# Altium footprint library ti82_lib.PcbLib: 12 footprints
Each footprint in its own frame and in the unit in brackets; x right, y up, seen from the top. Pads: shape width x height; smd on the part's side, far side on the other; paste and mask are expansions set on the pad; w line width, h text height; cw(c..) or ccw(c..) is an arc to the next point about the centre after c.
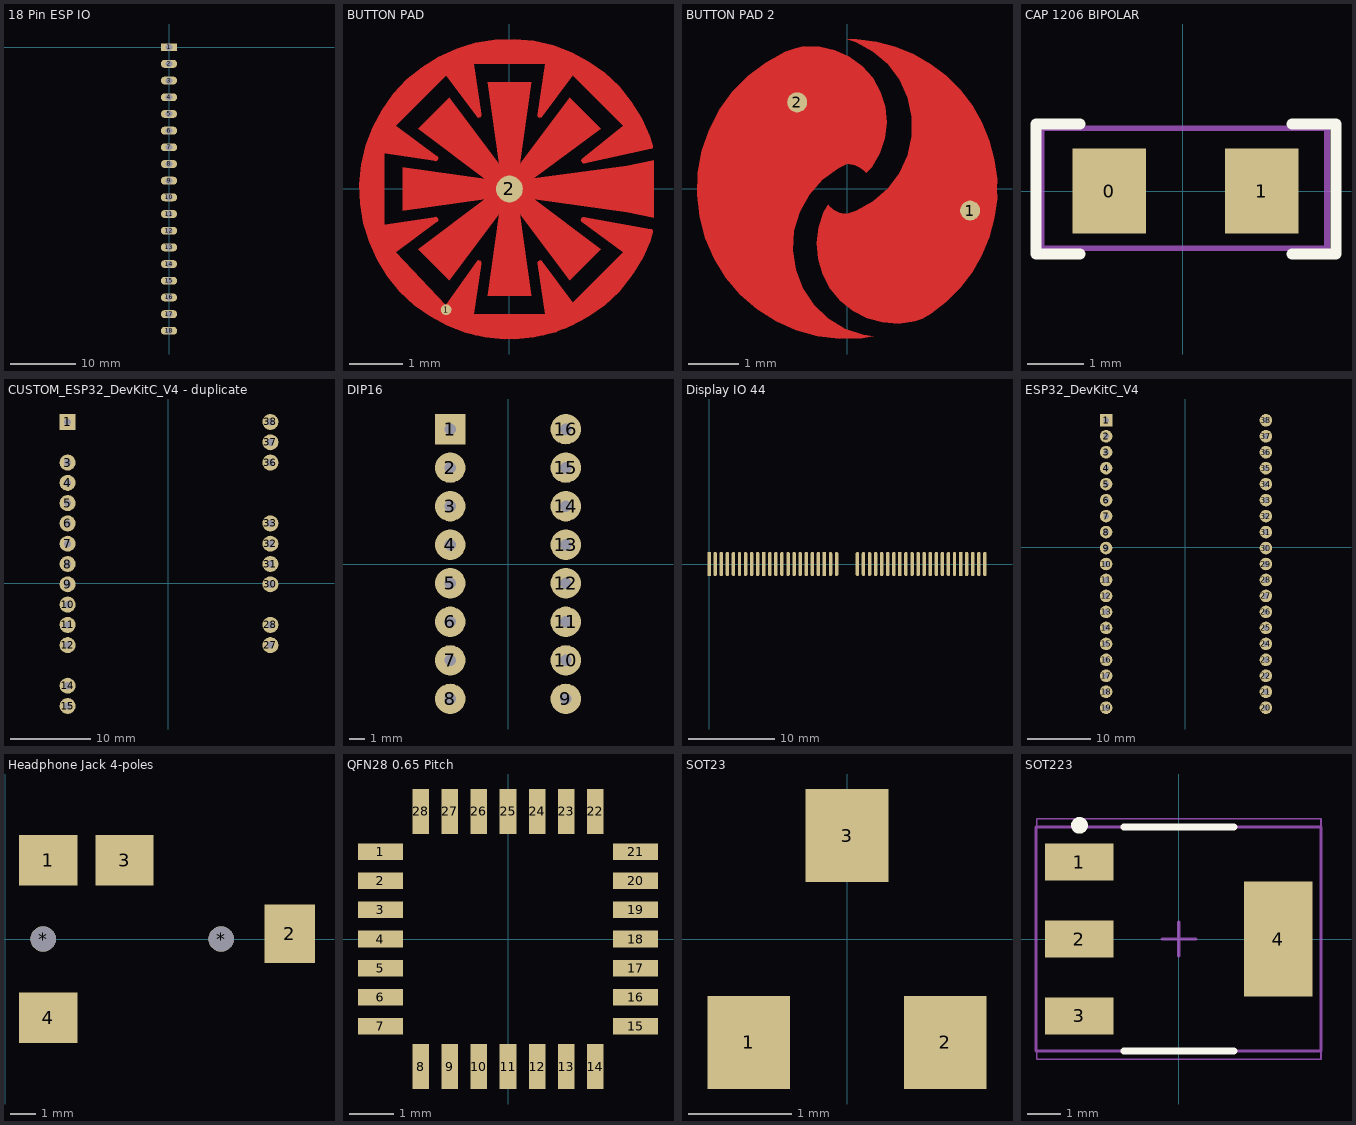
[diagram p0: the footprints below, top view; thin cyan lines are the x and y axes]

## 18 Pin ESP IO [mm]
pads (18):
  rect 2.5x1.2 hole 1: 1(0,0)
  oval 2.5x1.2 hole 1: 2(0,-2.54) 3(0,-5.08) 4(0,-7.62) 5(0,-10.16) 6(0,-12.7) 7(0,-15.24) 8(0,-17.78) 9(0,-20.32) 10(0,-22.86) 11(0,-25.4) 12(0,-27.94) 13(0,-30.48) 14(0,-33.02) 15(0,-35.56) 16(0,-38.1) 17(0,-40.64) 18(0,-43.18)

## BUTTON PAD [mm] "TI82"
pads (2):
  round 0.2 smd: 1(-1.185,-2.256)
  round 0.5 smd: 2(0,0)
Top Layer:
  region: -1.125,-1.704 -1.704,-1.125 -0.462,-0.191 -2,-0.41 -2,0.41 -0.462,0.191 -1.704,1.125 -1.125,1.704 -0.191,0.462 -0.41,2 0.41,2 0.191,0.462 1.125,1.704 1.703,1.125 0.455,0.197 2.207,0.439 2.697,0.536 2.697,-0.536 2.207,-0.439 0.462,-0.191 1.704,-1.125 1.125,-1.704 0.191,-0.462 0.41,-2 -0.41,-2 -0.191,-0.462
  region: -2.68,-0.813 -2.627,-0.989 -2.475,-1.323 -2.281,-1.635 -2.048,-1.918 -1.78,-2.169 -1.482,-2.383 -1.158,-2.556 -0.815,-2.686 -0.457,-2.769 -0.092,-2.805 0.275,-2.793 0.637,-2.733 0.813,-2.68 0.821,-2.677 0.834,-2.668 0.844,-2.655 0.849,-2.64 0.849,-2.632 0.849,-2.62 0.838,-2.598 0.819,-2.584 0.795,-2.58 0.784,-2.583 0.613,-2.629 0.265,-2.687 -0.088,-2.698 -0.44,-2.664 -0.784,-2.583 -1.114,-2.459 -1.426,-2.293 -1.713,-2.087 -1.97,-1.845 -2.194,-1.572 -2.381,-1.273 -2.527,-0.951 -2.583,-0.784 -2.589,-0.764 -2.626,-0.744 -2.666,-0.756 -2.686,-0.793
  region: 174 vertices and 0 holes, not listed, extent -2.805,-2.805 2.682,2.805
  region: -0.813,-2.68 -0.822,-2.677 -0.838,-2.664 -0.847,-2.646 -0.849,-2.627 -0.846,-2.617 -0.774,-2.378 -0.772,-2.37 -0.762,-2.357 -0.749,-2.347 -0.734,-2.342 -0.726,-2.342 0.726,-2.342 0.736,-2.342 0.754,-2.35 0.768,-2.364 0.776,-2.382 0.776,-2.392 0.776,-2.402 0.768,-2.421 0.754,-2.435 0.736,-2.443 0.726,-2.443 -0.688,-2.443 -0.735,-2.598 -0.48,-2.657 0.041,-2.699 0.561,-2.641 1.059,-2.483 1.518,-2.232 1.92,-1.898 2.25,-1.492 2.495,-1.03 2.583,-0.784 2.589,-0.766 2.62,-0.746 2.658,-0.751 2.682,-0.78 2.682,-0.798 2.682,-0.8 2.682,-0.804 2.681,-0.808 2.68,-0.811 2.68,-0.813 2.627,-0.989 2.475,-1.323 2.281,-1.635 2.048,-1.918 1.78,-2.169 1.482,-2.383 1.158,-2.556 0.815,-2.686 0.457,-2.769 0.092,-2.805 -0.275,-2.793 -0.637,-2.733
  region: -0.832,-2.568 -0.985,-2.514 -1.279,-2.377 -1.556,-2.206 -1.809,-2.003 -2.037,-1.772 -2.235,-1.514 -2.401,-1.235 -2.532,-0.938 -2.583,-0.784 -2.589,-0.764 -2.626,-0.744 -2.666,-0.756 -2.686,-0.793 -2.68,-0.813 -2.627,-0.989 -2.475,-1.323 -2.281,-1.635 -2.048,-1.918 -1.78,-2.169 -1.482,-2.383 -1.158,-2.556 -0.815,-2.686 -0.457,-2.769 -0.092,-2.805 0.275,-2.793 0.637,-2.733 0.813,-2.68 0.825,-2.676 0.834,-2.681 0.854,-2.683 0.874,-2.676 0.889,-2.663 0.894,-2.654 1.052,-2.601 1.353,-2.458 1.635,-2.28 1.894,-2.07 2.126,-1.83 2.328,-1.565 2.497,-1.278 2.631,-0.972 2.68,-0.813 2.68,-0.811 2.681,-0.808 2.682,-0.804 2.682,-0.8 2.682,-0.798 2.682,-0.78 2.657,-0.751 2.62,-0.746 2.589,-0.766 2.583,-0.784 2.532,-0.935 2.404,-1.229 2.241,-1.505 2.047,-1.759 1.825,-1.99 1.576,-2.192 1.306,-2.363 1.017,-2.501 0.867,-2.557 0.771,-2.369 0.767,-2.363 0.758,-2.353 0.746,-2.346 0.733,-2.342 0.726,-2.342 -0.726,-2.342 -0.734,-2.342 -0.749,-2.347 -0.762,-2.357 -0.772,-2.37 -0.774,-2.378
  lines w0.1: 0.798,-2.632 cw(c0,0) -2.632,-0.798 cw(c0,0) -0.798,2.632 cw(c0,0) 2.632,0.798 1.395,0.53 2.205,1.178 1.178,2.205 0.574,1.386 0.726,2.392 -0.726,2.392 -0.574,1.386 -1.178,2.205 -2.205,1.178 -1.386,0.574 -2.392,0.726 -2.392,-0.726 -1.386,-0.574 -2.205,-1.178 -1.185,-2.256 -0.574,-1.386 -0.726,-2.392 ; 0.844,-2.617 0.849,-2.626 ; 0.849,-2.632 0.726,-2.392 ; -0.726,-2.392 0.726,-2.392 ; -0.726,-2.392 -0.798,-2.632 ccw(c0,0) 2.632,-0.798 1.386,-0.574 2.205,-1.178 1.178,-2.205 0.574,-1.386 0.726,-2.392

## BUTTON PAD 2 [mm]
pads (2):
  round 0.4 smd: 1(2.462,-0.434) 2(-1,1.732)
Top Layer:
  region: 0.521,-2.954 0.301,-2.993 -0.144,-3.005 -0.587,-2.95 -1.017,-2.831 -1.424,-2.65 -1.8,-2.41 -2.136,-2.118 -2.426,-1.779 -2.662,-1.401 -2.84,-0.992 -2.955,-0.561 -3.006,-0.118 -2.99,0.327 -2.909,0.766 -2.764,1.187 -2.558,1.583 -2.296,1.944 -1.983,2.262 -1.627,2.53 -1.236,2.743 -1.026,2.819 -0.871,2.851 -0.553,2.848 -0.244,2.78 0.045,2.648 0.3,2.459 0.51,2.222 0.666,1.945 0.761,1.643 0.791,1.327 0.754,1.011 0.653,0.711 0.491,0.438 0.383,0.321 0.346,0.361 0.259,0.427 0.161,0.473 0.054,0.497 0,0.5 -0.177,0.412 -0.498,0.181 -0.76,-0.114 -0.952,-0.459 -1.064,-0.838 -1.092,-1.231 -1.033,-1.622 -0.891,-1.99 -0.672,-2.319 -0.386,-2.592 -0.048,-2.797 0.326,-2.923
  region: 1.5,-2.598 1.349,-2.652 1.031,-2.696 0.71,-2.675 0.401,-2.59 0.115,-2.443 -0.136,-2.242 -0.34,-1.995 -0.491,-1.711 -0.581,-1.403 -0.607,-1.083 -0.567,-0.764 -0.464,-0.46 -0.383,-0.321 -0.346,-0.361 -0.259,-0.427 -0.161,-0.473 -0.054,-0.497 0,-0.5 0.184,-0.435 0.525,-0.248 0.82,0.008 1.053,0.32 1.214,0.675 1.297,1.055 1.297,1.445 1.214,1.825 1.053,2.18 0.82,2.492 0.525,2.748 0.184,2.935 0,3 0.197,3 0.587,2.949 0.966,2.847 1.33,2.696 1.67,2.5 1.982,2.26 2.26,1.982 2.5,1.67 2.696,1.33 2.847,0.966 2.949,0.587 3,0.197 3,0 3,-0.197 2.949,-0.587 2.847,-0.966 2.696,-1.33 2.5,-1.67 2.26,-1.982 1.982,-2.26 1.67,-2.5

## CAP 1206 BIPOLAR [mm]
pads (2):
  rect 1.3x1.5 smd: 0(-1.3,0) 1(1.4,0)
Top Overlay:
  lines w0.2: -1.823,-1.113 -2.599,-1.113 -2.599,-1.013 -2.599,-0.781 -2.599,0.829 -2.599,1.187 -1.823,1.187 ; 1.935,-1.113 2.71,-1.113 2.71,1.187 1.935,1.187
Mechanical 13:
  lines w0.1: -2.498,-1.013 2.552,-1.013 2.552,1.112 -2.498,1.112 -2.498,-1.013
  text ".Designator" at -0.8,1.5 h1
3D body "User Library-cap_1206_0_95.STEP": height -0.55, standoff -1.5, extent -1.6,-0.8 1.6,0.8

## CUSTOM_ESP32_DevKitC_V4 - duplicate [mm]
pads (22):
  rect 2x2 hole 0.9: 1(-12.6,20.22)
  round 2 hole 0.9: 3(-12.6,15.14) 4(-12.6,12.6) 5(-12.6,10.06) 6(-12.6,7.52) 7(-12.6,4.98) 8(-12.6,2.44) 9(-12.6,-0.1) 10(-12.6,-2.64) 11(-12.6,-5.18) 12(-12.6,-7.72) 14(-12.6,-12.8) 15(-12.6,-15.34) 27(12.8,-7.72) 28(12.8,-5.18) 30(12.8,-0.1) 31(12.8,2.44) 32(12.8,4.98) 33(12.8,7.52) 36(12.8,15.14) 37(12.8,17.68) 38(12.8,20.22)
3D body "User Library-ESP32S Dev Board 0_9inch width ASSY.step": height 7.6, standoff -5.54, extent -12.654,-27.814 13.254,21.5

## DIP16 [mm] "Dual-In-Line Package, 2.54mm pitch"
pads (16):
  rect 2x2 hole 0.762: 1(-3.81,8.89)
  round 2 hole 0.762: 2(-3.81,6.35) 3(-3.81,3.81) 4(-3.81,1.27) 5(-3.81,-1.27) 6(-3.81,-3.81) 7(-3.81,-6.35) 8(-3.81,-8.89) 9(3.81,-8.89) 10(3.81,-6.35) 11(3.81,-3.81) 12(3.81,-1.27) 13(3.81,1.27) 14(3.81,3.81) 15(3.81,6.35) 16(3.81,8.89)
3D body "DIP16.step": height 4.19, standoff -2.57, extent -3.81,-10.795 4.064,10.795

## Display IO 44 [mm]
pads (44):
  rect 0.4x2.8 smd: 1(0,0) 10(6.3,0) 20(13.3,0) 30(22,0) 40(29,0)
  oval 0.4x2.8 smd: 2(0.7,0) 3(1.4,0) 4(2.1,0) 5(2.8,0) 6(3.5,0) 7(4.2,0) 8(4.9,0) 9(5.6,0) 11(7,0) 12(7.7,0) 13(8.4,0) 14(9.1,0) 15(9.8,0) 16(10.5,0) 17(11.2,0) 18(11.9,0) 19(12.6,0) 21(14,0) 22(14.7,0) 23(17.1,0) 24(17.8,0) 25(18.5,0) 26(19.2,0) 27(19.9,0) 28(20.6,0) 29(21.3,0) 31(22.7,0) 32(23.4,0) 33(24.1,0) 34(24.8,0) 35(25.5,0) 36(26.2,0) 37(26.9,0) 38(27.6,0) 39(28.3,0) 41(29.7,0) 42(30.4,0) 43(31.1,0) 44(31.8,0)

## ESP32_DevKitC_V4 [mm]
pads (38):
  rect 2x2 hole 0.9: 1(-12.6,20.22)
  round 2 hole 0.9: 2(-12.6,17.68) 3(-12.6,15.14) 4(-12.6,12.6) 5(-12.6,10.06) 6(-12.6,7.52) 7(-12.6,4.98) 8(-12.6,2.44) 9(-12.6,-0.1) 10(-12.6,-2.64) 11(-12.6,-5.18) 12(-12.6,-7.72) 13(-12.6,-10.26) 14(-12.6,-12.8) 15(-12.6,-15.34) 16(-12.6,-17.88) 17(-12.6,-20.42) 18(-12.6,-22.96) 19(-12.6,-25.5) 20(12.8,-25.5) 21(12.8,-22.96) 22(12.8,-20.42) 23(12.8,-17.88) 24(12.8,-15.34) 25(12.8,-12.8) 26(12.8,-10.26) 27(12.8,-7.72) 28(12.8,-5.18) 29(12.8,-2.64) 30(12.8,-0.1) 31(12.8,2.44) 32(12.8,4.98) 33(12.8,7.52) 34(12.8,10.06) 35(12.8,12.6) 36(12.8,15.14) 37(12.8,17.68) 38(12.8,20.22)
3D body "User Library-ESP32S Dev Board 0_9inch width ASSY.step": height 7.6, standoff -5.54, extent -12.654,-27.814 13.254,21.5

## Headphone Jack 4-poles [mm]
pads (6):
  rect 2.3x2 smd: 1(1.7,3.1) 3(4.7,3.1) 4(1.7,-3.1)
  rect 2x2.3 smd: 2(11.2,0.2)
  round 1 hole 1 unplated: *(1.5,0) *(8.5,0)

## QFN28 0.65 Pitch [mm]
pads (28):
  rect 1x0.37 smd: 1(-2.85,1.95) 2(-2.85,1.3) 3(-2.85,0.65) 4(-2.85,0) 5(-2.85,-0.65) 6(-2.85,-1.3) 7(-2.85,-1.95) 15(2.85,-1.95) 16(2.85,-1.3) 17(2.85,-0.65) 18(2.85,0) 19(2.85,0.65) 20(2.85,1.3) 21(2.85,1.95)
  rect 0.37x1 smd: 8(-1.95,-2.85) 9(-1.3,-2.85) 10(-0.65,-2.85) 11(0,-2.85) 12(0.65,-2.85) 13(1.3,-2.85) 14(1.95,-2.85) 22(1.95,2.85) 23(1.3,2.85) 24(0.65,2.85) 25(0,2.85) 26(-0.65,2.85) 27(-1.3,2.85) 28(-1.95,2.85)
3D body "QFN 28-Pin 0_65mm Pitch.step": height 1, standoff 0, extent -3.01,-3.01 3.01,3.01

## SOT23 [mm]
pads (3):
  rect 0.8x0.9 smd: 1(-0.95,-1) 2(0.95,-1) 3(0,1)
3D body "CircuitWorks-SOT-23.step": height 1.1, standoff 0, extent -1.5,-1.25 1.5,1.25

## SOT223 [mm]
pads (4):
  rect 2.05x1.1 smd: 1(-2.975,2.3) 2(-2.975,0) 3(-2.975,-2.3)
  rect 2.05x3.45 smd: 4(2.975,0)
Top Overlay:
  circle w0.25: c-2.975,3.4 r0.125
  lines w0.2: -1.65,-3.35 1.65,-3.35 ; -1.65,3.35 1.65,3.35
Mechanical 13:
  lines w0.1: -4.275,-3.35 4.25,-3.35 4.25,3.35 -4.275,3.35 -4.275,-3.35
  text "'.Designator'" at 0.325,-3.175 h1
Mechanical 15:
  lines w0.05: -4.25,-3.6 4.25,-3.6 4.25,3.6 -4.25,3.6 -4.25,-3.6
  lines w0.1: -0.5,0 0.5,0 ; 0,-0.5 0,0.5
  text ".Designator" at -0.625,5 h1
3D body "CircuitWorks-SOT-223.step": height 1.7, standoff 0.02, extent -3.48,-3.25 3.48,3.25